# Altium footprint library Evaluation Board.PcbLib: 121 footprints (part 1 of 8)
Each footprint in its own frame and in the unit in brackets; x right, y up, seen from the top. Pads: shape width x height; smd on the part's side, far side on the other; paste and mask are expansions set on the pad; w line width, h text height; cw(c..) or ccw(c..) is an arc to the next point about the centre after c.
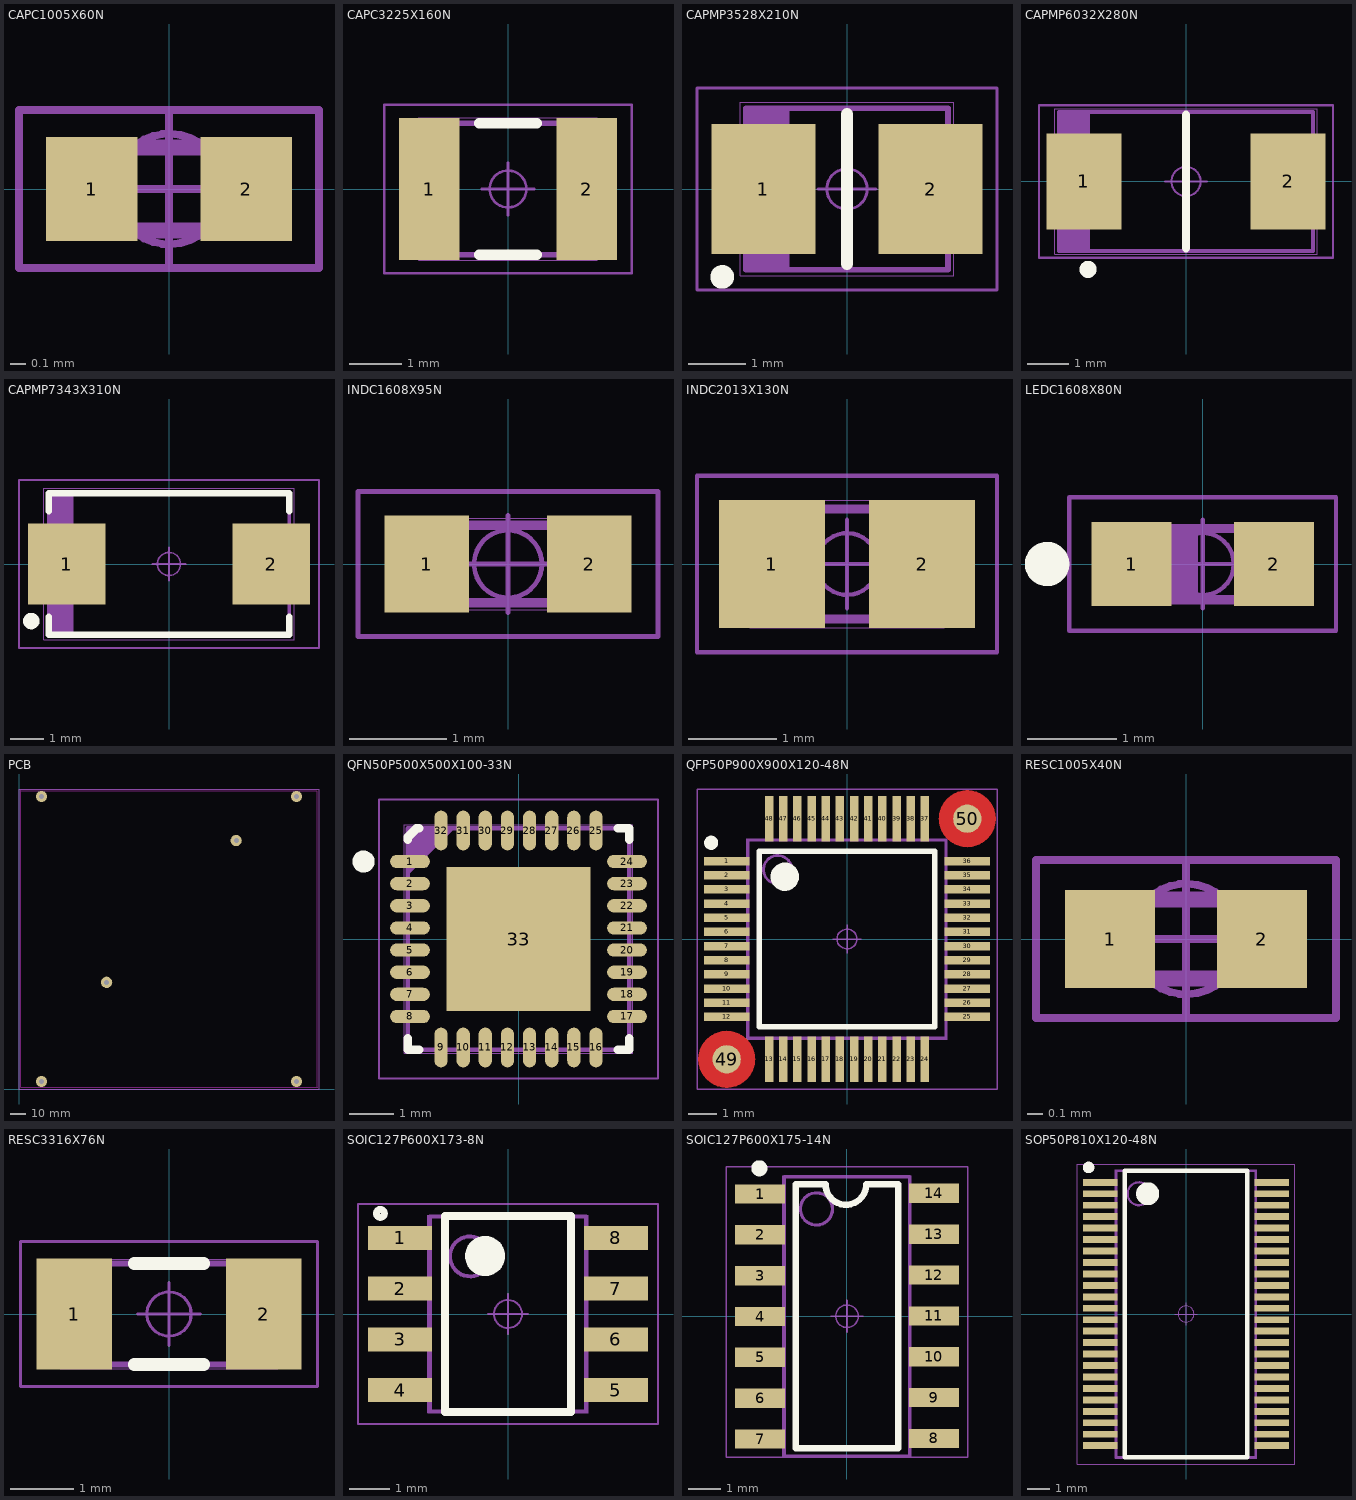
[diagram p0: the footprints below, top view; thin cyan lines are the x and y axes]

## CAPC1005X60N [mm]
height 0.5
pads (2):
  rect 0.58x0.66 smd: 1(-0.49,0) 2(0.49,0)
Mechanical 1:
  circle w0.05: c0,0 r0.35
  lines w0.05: -0.5,0 0.5,0 ; 0,-0.5 0,0.5 ; -0.95,-0.5 -0.95,0.5 0.95,0.5 0.95,-0.5 -0.95,-0.5
Mechanical 2:
  lines w0.001: -0.55,-0.3 -0.55,0.3 0.55,0.3 0.55,-0.3 -0.55,-0.3
Mechanical 3:
  lines w0.1: -0.512,-0.262 -0.512,0.262 0.512,0.262 0.512,-0.262 -0.512,-0.262
3D body: height 0.5, standoff 0, extent -0.55,-0.3 0.55,0.3

## CAPC3225X160N [mm]
height 1.9
pads (2):
  rect 1.15x2.7 smd: 1(-1.5,0) 2(1.5,0)
Top Overlay:
  lines w0.2: -0.55,-1.25 0.55,-1.25 ; -0.55,1.25 0.55,1.25
Mechanical 1:
  circle w0.05: c0,0 r0.35
  lines w0.05: -0.5,0 0.5,0 ; 0,-0.5 0,0.5 ; -2.35,-1.6 -2.35,1.6 2.35,1.6 2.35,-1.6 -2.35,-1.6
Mechanical 2:
  lines w0.001: -1.7,-1.35 -1.7,1.35 1.7,1.35 1.7,-1.35 -1.7,-1.35
Mechanical 3:
  lines w0.1: -1.6,-1.25 -1.6,1.25 1.6,1.25 1.6,-1.25 -1.6,-1.25
3D body: height 1.9, standoff 0, extent -1.7,-1.35 1.7,1.35

## CAPMP3528X210N [mm]
height 1.9
pads (2):
  rect 1.8x2.25 smd: 1(-1.45,0) 2(1.45,0)
Top Overlay:
  circle w0.25: c-2.163,-1.524 r0.08
  lines w0.2: 0,-1.3 0,1.3
Mechanical 1:
  circle w0.05: c0,0 r0.35
  lines w0.05: -0.5,0 0.5,0 ; 0,-0.5 0,0.5 ; -2.6,-1.75 2.6,-1.75 2.6,1.75 -2.6,1.75 -2.6,-1.75
Mechanical 2:
  lines w0.001: -1.85,-1.5 1.85,-1.5 1.85,1.5 -1.85,1.5 -1.85,-1.5
Mechanical 3:
  lines w0.1: -1.65,-1.4 -1.65,1.4 ; -1.55,-1.4 -1.55,1.4 ; -1.45,-1.4 -1.45,1.4 ; -1.35,-1.4 -1.35,1.4 ; -1.25,-1.4 -1.25,1.4 ; -1.15,-1.4 -1.15,1.4 ; -1.05,-1.4 -1.05,1.4 ; -1.75,-1.4 1.75,-1.4 1.75,1.4 -1.75,1.4 ; -1.75,-1.4 -1.75,1.4 ; -1.75,-1.4 -1.75,1.4
3D body: height 1.9, standoff 0, extent -1.85,-1.5 -0.991,1.5
3D body: height 1.9, standoff 0, extent -0.991,-1.5 1.85,1.5

## CAPMP6032X280N [mm] "Cap Polarized 6032"
height 2.8
pads (2):
  rect 1.8x2.3 smd: 1(-2.45,0) 2(2.45,0)
Top Overlay:
  circle w0.25: c-2.35,-2.11 r0.08
  lines w0.2: 0,-1.6 0,1.6
Mechanical 1:
  circle w0.05: c0,0 r0.35
  lines w0.05: -0.5,0 0.5,0 ; 0,-0.5 0,0.5 ; -3.53,-1.83 3.53,-1.83 3.53,1.83 -3.53,1.83 -3.53,-1.83
Mechanical 2:
  lines w0.001: -3.15,-1.75 -3.15,1.75 3.15,1.75 3.15,-1.75 -3.15,-1.75
Mechanical 3:
  lines w0.1: -2.95,-1.67 -2.95,1.67 ; -2.85,-1.67 -2.85,1.67 ; -2.75,-1.67 -2.75,1.67 ; -2.65,-1.67 -2.65,1.67 ; -2.55,-1.67 -2.55,1.67 ; -2.45,-1.67 -2.45,1.67 ; -2.35,-1.67 -2.35,1.67 ; -3.05,-1.67 -3.05,1.67 3.05,1.67 3.05,-1.67 -3.05,-1.67
3D body: height 2.8, standoff 0, extent -2.25,-1.75 3.15,1.75
3D body: height 2.8, standoff 0, extent -3.15,-1.75 -2.25,1.75

## CAPMP7343X310N [mm]
height 2.8
pads (2):
  rect 2.35x2.45 smd: 1(-3.1,0) 2(3.1,0)
Top Overlay:
  circle w0.25: c-4.176,-1.73 r0.125
  lines w0.2: -3.65,-1.6 -3.65,-2.15 3.65,-2.15 3.65,-1.6 ; -3.65,1.6 -3.65,2.15 3.65,2.15 3.65,1.6
Mechanical 1:
  circle w0.05: c0,0 r0.35
  lines w0.05: -0.5,0 0.5,0 ; 0,-0.5 0,0.5 ; -4.55,-2.55 4.55,-2.55 4.55,2.55 -4.55,2.55 -4.55,-2.55
Mechanical 2:
  lines w0.001: -3.8,-2.3 3.8,-2.3 3.8,2.3 -3.8,2.3 -3.8,-2.3
Mechanical 3:
  lines w0.1: -3.55,-2.15 -3.55,2.15 ; -3.45,-2.15 -3.45,2.15 ; -3.35,-2.15 -3.35,2.15 ; -3.25,-2.15 -3.25,2.15 ; -3.15,-2.15 -3.15,2.15 ; -3.05,-2.15 -3.05,2.15 ; -2.95,-2.15 -2.95,2.15 ; -3.65,-2.15 3.65,-2.15 3.65,2.15 -3.65,2.15 ; -3.65,-2.15 -3.65,2.15 ; -3.65,-2.15 -3.65,2.15
3D body: height 2.8, standoff 0, extent -2.9,-2.3 3.8,2.3
3D body: height 2.8, standoff 0, extent -3.8,-2.3 -2.9,2.3

## INDC1608X95N [mm]
height 0.6
pads (2):
  rect 0.87x1 smd: 1(-0.84,0) 2(0.84,0)
Mechanical 1:
  circle w0.05: c0,0 r0.35
  lines w0.05: -0.5,0 0.5,0 ; 0,-0.5 0,0.5 ; -1.55,-0.75 1.55,-0.75 1.55,0.75 -1.55,0.75 -1.55,-0.75
Mechanical 2:
  lines w0.001: -0.875,-0.475 0.875,-0.475 0.875,0.475 -0.875,0.475 -0.875,-0.475
Mechanical 3:
  lines w0.1: -0.8,-0.4 0.8,-0.4 0.8,0.4 -0.8,0.4 -0.8,-0.4
3D body: height 0.6, standoff 0, extent -0.875,-0.475 0.875,0.475

## INDC2013X130N [mm]
height 0.9
pads (2):
  rect 1.2x1.45 smd: 1(-0.85,0) 2(0.85,0)
Mechanical 1:
  circle w0.05: c0,0 r0.35
  lines w0.05: -0.5,0 0.5,0 ; 0,-0.5 0,0.5 ; -1.7,-1 -1.7,1 1.7,1 1.7,-1 -1.7,-1
Mechanical 2:
  lines w0.001: -1.1,-0.725 -1.1,0.725 1.1,0.725 1.1,-0.725 -1.1,-0.725
Mechanical 3:
  lines w0.1: -1,-0.625 -1,0.625 1,0.625 1,-0.625 -1,-0.625
3D body: height 0.9, standoff 0, extent -1.1,-0.725 1.1,0.725

## LEDC1608X80N [mm]
height 0.8
pads (2):
  rect 0.9x0.95 smd: 1(-0.8,0) 2(0.8,0)
Top Overlay:
  circle w0.25: c-1.75,0 r0.125
Mechanical 1:
  circle w0.05: c0,0 r0.35
  lines w0.05: -0.5,0 0.5,0 ; 0,-0.5 0,0.5 ; -1.5,-0.75 1.5,-0.75 1.5,0.75 -1.5,0.75 -1.5,-0.75
Mechanical 2:
  lines w0.001: -0.9,-0.45 0.9,-0.45 0.9,0.45 -0.9,0.45 -0.9,-0.45
Mechanical 3:
  lines w0.1: -0.7,-0.4 -0.7,0.4 ; -0.6,-0.4 -0.6,0.4 ; -0.5,-0.4 -0.5,0.4 ; -0.4,-0.4 -0.4,0.4 ; -0.3,-0.4 -0.3,0.4 ; -0.2,-0.4 -0.2,0.4 ; -0.1,-0.4 -0.1,0.4 ; -0.8,-0.4 0.8,-0.4 0.8,0.4 -0.8,0.4 ; -0.8,-0.4 -0.8,0.4 ; -0.8,-0.4 -0.8,0.4

## PCB [mm] "PCB Holes"
pads (6):
  round 7.5 hole 3.2: ""(15,195) ""(15,5) ""(58.42,71.12) ""(144.78,165.608) ""(185,195) ""(185,5)
Keep-Out Layer:
  lines w0.01: 1,1 1,199 199,199 199,1 1,1
Mechanical 15:
  lines w0.01: 0,0 0,200 200,200 200,0 0,0

## QFN50P500X500X100-33N [mm]
height 1
pads (33):
  oval 0.9x0.3 smd: 1(-2.45,1.75) 2(-2.45,1.25) 3(-2.45,0.75) 4(-2.45,0.25) 5(-2.45,-0.25) 6(-2.45,-0.75) 7(-2.45,-1.25) 8(-2.45,-1.75) 17(2.45,-1.75) 18(2.45,-1.25) 19(2.45,-0.75) 20(2.45,-0.25) 21(2.45,0.25) 22(2.45,0.75) 23(2.45,1.25) 24(2.45,1.75)
  oval 0.3x0.9 smd: 9(-1.75,-2.45) 10(-1.25,-2.45) 11(-0.75,-2.45) 12(-0.25,-2.45) 13(0.25,-2.45) 14(0.75,-2.45) 15(1.25,-2.45) 16(1.75,-2.45) 25(1.75,2.45) 26(1.25,2.45) 27(0.75,2.45) 28(0.25,2.45) 29(-0.25,2.45) 30(-0.75,2.45) 31(-1.25,2.45) 32(-1.75,2.45)
  rect 3.25x3.25 smd paste-0.595: 33(0,0)
Top Overlay:
  circle w0.25: c-3.5,1.75 r0.125
  lines w0.2: -2.5,-2.25 -2.5,-2.5 -2.25,-2.5 ; -2.5,2.25 -2.5,2.3 -2.3,2.5 -2.25,2.5 ; 2.25,-2.5 2.5,-2.5 2.5,-2.25 ; 2.25,2.5 2.5,2.5 2.5,2.25
Mechanical 1:
  circle w0.05: c0,0 r0.35
  lines w0.05: -0.5,0 0.5,0 ; 0,-0.5 0,0.5 ; -3.15,-3.15 3.15,-3.15 3.15,3.15 -3.15,3.15 -3.15,-3.15
Mechanical 2:
  lines w0.001: -2.575,-2.575 2.575,-2.575 2.575,2.575 -2.575,2.575 -2.575,-2.575
Mechanical 3:
  lines w0.1: -2.5,1.5 -1.5,2.5 ; -2.5,1.6 -1.6,2.5 ; -2.5,1.7 -1.7,2.5 ; -2.5,1.8 -1.8,2.5 ; -2.5,1.9 -1.9,2.5 ; -2.5,2 -2,2.5 ; -2.5,2.1 -2.1,2.5 ; -2.5,2.2 -2.2,2.5 ; -2.5,2.3 -2.3,2.5 ; -2.5,2.4 -2.4,2.5 ; -2.5,-2.5 2.5,-2.5 2.5,2.5 -2.5,2.5 -2.5,-2.5
3D body: height 1, standoff 0, extent -2.575,-2.575 2.575,2.575

## QFP50P900X900X120-48N [mm]
height 1.6
pads (50):
  rect 1.6x0.3 smd: 1(-4.25,2.75) 2(-4.25,2.25) 3(-4.25,1.75) 4(-4.25,1.25) 5(-4.25,0.75) 6(-4.25,0.25) 7(-4.25,-0.25) 8(-4.25,-0.75) 9(-4.25,-1.25) 10(-4.25,-1.75) 11(-4.25,-2.25) 12(-4.25,-2.75) 25(4.25,-2.75) 26(4.25,-2.25) 27(4.25,-1.75) 28(4.25,-1.25) 29(4.25,-0.75) 30(4.25,-0.25) 31(4.25,0.25) 32(4.25,0.75) 33(4.25,1.25) 34(4.25,1.75) 35(4.25,2.25) 36(4.25,2.75)
  rect 0.3x1.6 smd: 13(-2.75,-4.25) 14(-2.25,-4.25) 15(-1.75,-4.25) 16(-1.25,-4.25) 17(-0.75,-4.25) 18(-0.25,-4.25) 19(0.25,-4.25) 20(0.75,-4.25) 21(1.25,-4.25) 22(1.75,-4.25) 23(2.25,-4.25) 24(2.75,-4.25) 37(2.75,4.25) 38(2.25,4.25) 39(1.75,4.25) 40(1.25,4.25) 41(0.75,4.25) 42(0.25,4.25) 43(-0.25,4.25) 44(-0.75,4.25) 45(-1.25,4.25) 46(-1.75,4.25) 47(-2.25,4.25) 48(-2.75,4.25)
  round 1 smd paste-1 mask+0: 49(-4.25,-4.25) 50(4.25,4.25)
Top Layer:
  pour cut-out: 5.25,4.25 5.249,4.306 5.244,4.362 5.236,4.418 5.225,4.473 5.211,4.527 5.194,4.58 5.174,4.633 5.151,4.684 5.126,4.734 5.097,4.782 5.066,4.829 5.032,4.874 4.996,4.917 4.957,4.957 4.917,4.996 4.874,5.032 4.829,5.066 4.782,5.097 4.734,5.126 4.684,5.151 4.633,5.174 4.58,5.194 4.527,5.211 4.473,5.225 4.418,5.236 4.362,5.244 4.306,5.249 4.25,5.25 4.194,5.249 4.138,5.244 4.082,5.236 4.027,5.225 3.973,5.211 3.92,5.194 3.867,5.174 3.816,5.151 3.766,5.126 3.718,5.097 3.671,5.066 3.626,5.032 3.583,4.996 3.543,4.957 3.504,4.917 3.468,4.874 3.434,4.829 3.403,4.782 3.374,4.734 3.349,4.684 3.326,4.633 3.306,4.58 3.289,4.527 3.275,4.473 3.264,4.418 3.256,4.362 3.251,4.306 3.25,4.25 3.251,4.194 3.256,4.138 3.264,4.082 3.275,4.027 3.289,3.973 3.306,3.92 3.326,3.867 3.349,3.816 3.374,3.766 3.403,3.718 3.434,3.671 3.468,3.626 3.504,3.583 3.543,3.543 3.583,3.504 3.626,3.468 3.671,3.434 3.718,3.403 3.766,3.374 3.816,3.349 3.867,3.326 3.92,3.306 3.973,3.289 4.027,3.275 4.082,3.264 4.138,3.256 4.194,3.251 4.25,3.25 4.306,3.251 4.362,3.256 4.418,3.264 4.473,3.275 4.527,3.289 4.58,3.306 4.633,3.326 4.684,3.349 4.734,3.374 4.782,3.403 4.829,3.434 4.874,3.468 4.917,3.504 4.957,3.543 4.996,3.583 5.032,3.626 5.066,3.671 5.097,3.718 5.126,3.766 5.151,3.816 5.174,3.867 5.194,3.92 5.211,3.973 5.225,4.027 5.236,4.082 5.244,4.138 5.249,4.194
  pour cut-out: -3.25,-4.25 -3.251,-4.194 -3.256,-4.138 -3.264,-4.082 -3.275,-4.027 -3.289,-3.973 -3.306,-3.92 -3.326,-3.867 -3.349,-3.816 -3.374,-3.766 -3.403,-3.718 -3.434,-3.671 -3.468,-3.626 -3.504,-3.583 -3.543,-3.543 -3.583,-3.504 -3.626,-3.468 -3.671,-3.434 -3.718,-3.403 -3.766,-3.374 -3.816,-3.349 -3.867,-3.326 -3.92,-3.306 -3.973,-3.289 -4.027,-3.275 -4.082,-3.264 -4.138,-3.256 -4.194,-3.251 -4.25,-3.25 -4.306,-3.251 -4.362,-3.256 -4.418,-3.264 -4.473,-3.275 -4.527,-3.289 -4.58,-3.306 -4.633,-3.326 -4.684,-3.349 -4.734,-3.374 -4.782,-3.403 -4.829,-3.434 -4.874,-3.468 -4.917,-3.504 -4.957,-3.543 -4.996,-3.583 -5.032,-3.626 -5.066,-3.671 -5.097,-3.718 -5.126,-3.766 -5.151,-3.816 -5.174,-3.867 -5.194,-3.92 -5.211,-3.973 -5.225,-4.027 -5.236,-4.082 -5.244,-4.138 -5.249,-4.194 -5.25,-4.25 -5.249,-4.306 -5.244,-4.362 -5.236,-4.418 -5.225,-4.473 -5.211,-4.527 -5.194,-4.58 -5.174,-4.633 -5.151,-4.684 -5.126,-4.734 -5.097,-4.782 -5.066,-4.829 -5.032,-4.874 -4.996,-4.917 -4.957,-4.957 -4.917,-4.996 -4.874,-5.032 -4.829,-5.066 -4.782,-5.097 -4.734,-5.126 -4.684,-5.151 -4.633,-5.174 -4.58,-5.194 -4.527,-5.211 -4.473,-5.225 -4.418,-5.236 -4.362,-5.244 -4.306,-5.249 -4.25,-5.25 -4.194,-5.249 -4.138,-5.244 -4.082,-5.236 -4.027,-5.225 -3.973,-5.211 -3.92,-5.194 -3.867,-5.174 -3.816,-5.151 -3.766,-5.126 -3.718,-5.097 -3.671,-5.066 -3.626,-5.032 -3.583,-4.996 -3.543,-4.957 -3.504,-4.917 -3.468,-4.874 -3.434,-4.829 -3.403,-4.782 -3.374,-4.734 -3.349,-4.684 -3.326,-4.633 -3.306,-4.58 -3.289,-4.527 -3.275,-4.473 -3.264,-4.418 -3.256,-4.362 -3.251,-4.306
Top Overlay:
  circle w0.25: c-4.8,3.4 r0.125
  circle w0.5: c-2.2,2.2 r0.25
  lines w0.2: -3.1,-3.1 3.1,-3.1 3.1,3.1 -3.1,3.1 -3.1,-3.1
Mechanical 1:
  circle w0.05: c0,0 r0.35
  lines w0.05: -0.5,0 0.5,0 ; 0,-0.5 0,0.5 ; -5.3,-5.3 5.3,-5.3 5.3,5.3 -5.3,5.3 -5.3,-5.3
Mechanical 2:
  lines w0.001: -3.55,-3.55 3.55,-3.55 3.55,3.55 -3.55,3.55 -3.55,-3.55
Mechanical 3:
  circle w0.1: c-2.45,2.45 r0.5
  lines w0.1: -3.5,-3.5 3.5,-3.5 3.5,3.5 -3.5,3.5 -3.5,-3.5
3D body: height 1.6, standoff 0, extent -3.55,-3.55 3.55,3.55

## RESC1005X40N [mm]
height 0.35
pads (2):
  rect 0.57x0.62 smd: 1(-0.48,0) 2(0.48,0)
Mechanical 1:
  circle w0.05: c0,0 r0.35
  lines w0.05: -0.5,0 0.5,0 ; 0,-0.5 0,0.5 ; -0.95,-0.5 0.95,-0.5 0.95,0.5 -0.95,0.5 -0.95,-0.5
Mechanical 2:
  lines w0.001: -0.525,-0.275 0.525,-0.275 0.525,0.275 -0.525,0.275 -0.525,-0.275
Mechanical 3:
  lines w0.1: -0.5,-0.25 0.5,-0.25 0.5,0.25 -0.5,0.25 -0.5,-0.25
3D body: height 0.35, standoff 0, extent -0.525,-0.275 0.525,0.275

## RESC3316X76N [mm]
height 0.6
pads (2):
  rect 1.2x1.75 smd: 1(-1.5,0) 2(1.5,0)
Top Overlay:
  lines w0.2: -0.55,-0.8 0.55,-0.8 ; -0.55,0.8 0.55,0.8
Mechanical 1:
  circle w0.05: c0,0 r0.35
  lines w0.05: -0.5,0 0.5,0 ; 0,-0.5 0,0.5 ; -2.35,-1.15 2.35,-1.15 2.35,1.15 -2.35,1.15 -2.35,-1.15
Mechanical 2:
  lines w0.001: -1.725,-0.865 1.725,-0.865 1.725,0.865 -1.725,0.865 -1.725,-0.865
Mechanical 3:
  lines w0.1: -1.63,-0.8 1.63,-0.8 1.63,0.8 -1.63,0.8 -1.63,-0.8
3D body: height 0.6, standoff 0, extent -1.725,-0.865 1.725,0.865

## SOIC127P600X173-8N [mm]
height 1.75
pads (8):
  rect 1.6x0.6 smd: 1(-2.7,1.905) 2(-2.7,0.635) 3(-2.7,-0.635) 4(-2.7,-1.905) 5(2.7,-1.905) 6(2.7,-0.635) 7(2.7,0.635) 8(2.7,1.905)
Top Overlay:
  circle w0.17: c-3.191,2.515 r0.1
  circle w0.5: c-0.575,1.45 r0.25
  lines w0.2: -1.575,-2.45 -1.575,2.45 1.575,2.45 1.575,-2.45 -1.575,-2.45
Mechanical 1:
  circle w0.05: c0,0 r0.35
  lines w0.05: -0.5,0 0.5,0 ; 0,-0.5 0,0.5 ; -3.75,-2.75 -3.75,2.75 3.75,2.75 3.75,-2.75 -3.75,-2.75
Mechanical 2:
  lines w0.001: -2,-2.475 -2,2.475 2,2.475 2,-2.475 -2,-2.475
Mechanical 3:
  circle w0.1: c-0.95,1.44 r0.5
  lines w0.1: -1.95,-2.44 -1.95,2.44 1.95,2.44 1.95,-2.44 -1.95,-2.44
3D body: height 1.75, standoff 0, extent -2,-2.475 2,2.475

## SOIC127P600X175-14N [mm] "SOIC 14 pin"
height 1.6
pads (14):
  rect 1.55x0.6 smd: 1(-2.7,3.8) 2(-2.7,2.53) 3(-2.7,1.26) 4(-2.7,-0.01) 5(-2.7,-1.28) 6(-2.7,-2.55) 7(-2.7,-3.82) 8(2.7,-3.8) 9(2.7,-2.53) 10(2.7,-1.26) 11(2.7,0.01) 12(2.7,1.28) 13(2.7,2.55) 14(2.7,3.82)
Top Overlay:
  circle w0.25: c-2.725,4.6 r0.125
  lines w0.2: -1.6,-4.1 1.6,-4.1 1.6,4.1 0.6,4.1 cw(c-0.033,4.1) -0.667,4.1 -1.6,4.1 -1.6,-4.1
Mechanical 1:
  circle w0.05: c0,0 r0.35
  lines w0.05: -0.5,0 0.5,0 ; 0,-0.5 0,0.5 ; -3.75,-4.384 3.75,-4.384 3.75,4.645 -3.75,4.645 -3.75,-4.384
Mechanical 2:
  lines w0.001: -2,-4.375 2,-4.375 2,4.375 -2,4.375 -2,-4.375
Mechanical 3:
  circle w0.1: c-0.95,3.335 r0.5
  lines w0.1: -1.95,-4.343 -1.95,4.335 1.95,4.335 1.95,-4.343 -1.95,-4.343
3D body: height 1.6, standoff 0, extent -2,-4.375 2,4.375

## SOP50P810X120-48N [mm]
height 1.1
pads (48):
  rect 1.5x0.3 smd: 1(-3.75,5.75) 2(-3.75,5.25) 3(-3.75,4.75) 4(-3.75,4.25) 5(-3.75,3.75) 6(-3.75,3.25) 7(-3.75,2.75) 8(-3.75,2.25) 9(-3.75,1.75) 10(-3.75,1.25) 11(-3.75,0.75) 12(-3.75,0.25) 13(-3.75,-0.25) 14(-3.75,-0.75) 15(-3.75,-1.25) 16(-3.75,-1.75) 17(-3.75,-2.25) 18(-3.75,-2.75) 19(-3.75,-3.25) 20(-3.75,-3.75) 21(-3.75,-4.25) 22(-3.75,-4.75) 23(-3.75,-5.25) 24(-3.75,-5.75) 25(3.75,-5.75) 26(3.75,-5.25) 27(3.75,-4.75) 28(3.75,-4.25) 29(3.75,-3.75) 30(3.75,-3.25) 31(3.75,-2.75) 32(3.75,-2.25) 33(3.75,-1.75) 34(3.75,-1.25) 35(3.75,-0.75) 36(3.75,-0.25) 37(3.75,0.25) 38(3.75,0.75) 39(3.75,1.25) 40(3.75,1.75) 41(3.75,2.25) 42(3.75,2.75) 43(3.75,3.25) 44(3.75,3.75) 45(3.75,4.25) 46(3.75,4.75) 47(3.75,5.25) 48(3.75,5.75)
Top Overlay:
  circle w0.5: c-1.675,5.25 r0.25
  circle w0.25: c-4.25,6.4 r0.125
  lines w0.2: -2.675,-6.25 2.675,-6.25 2.675,6.25 -2.675,6.25 -2.675,-6.25
Mechanical 1:
  circle w0.05: c0,0 r0.35
  lines w0.05: -0.5,0 0.5,0 ; 0,-0.5 0,0.5 ; -4.75,-6.55 4.75,-6.55 4.75,6.55 -4.75,6.55 -4.75,-6.55
Mechanical 2:
  lines w0.001: -3.1,-6.3 3.1,-6.3 3.1,6.3 -3.1,6.3 -3.1,-6.3
Mechanical 3:
  circle w0.1: c-2.05,5.25 r0.5
  lines w0.1: -3.05,-6.25 3.05,-6.25 3.05,6.25 -3.05,6.25 -3.05,-6.25
3D body: height 1.1, standoff 0, extent -3.1,-6.3 3.1,6.3